# Altium footprint library texas.PCBLIB: 124 footprints (part 3 of 12)
Each footprint in its own frame and in the unit in brackets; x right, y up, seen from the top. Pads: shape width x height; smd on the part's side, far side on the other; paste and mask are expansions set on the pad; w line width, h text height; cw(c..) or ccw(c..) is an arc to the next point about the centre after c.
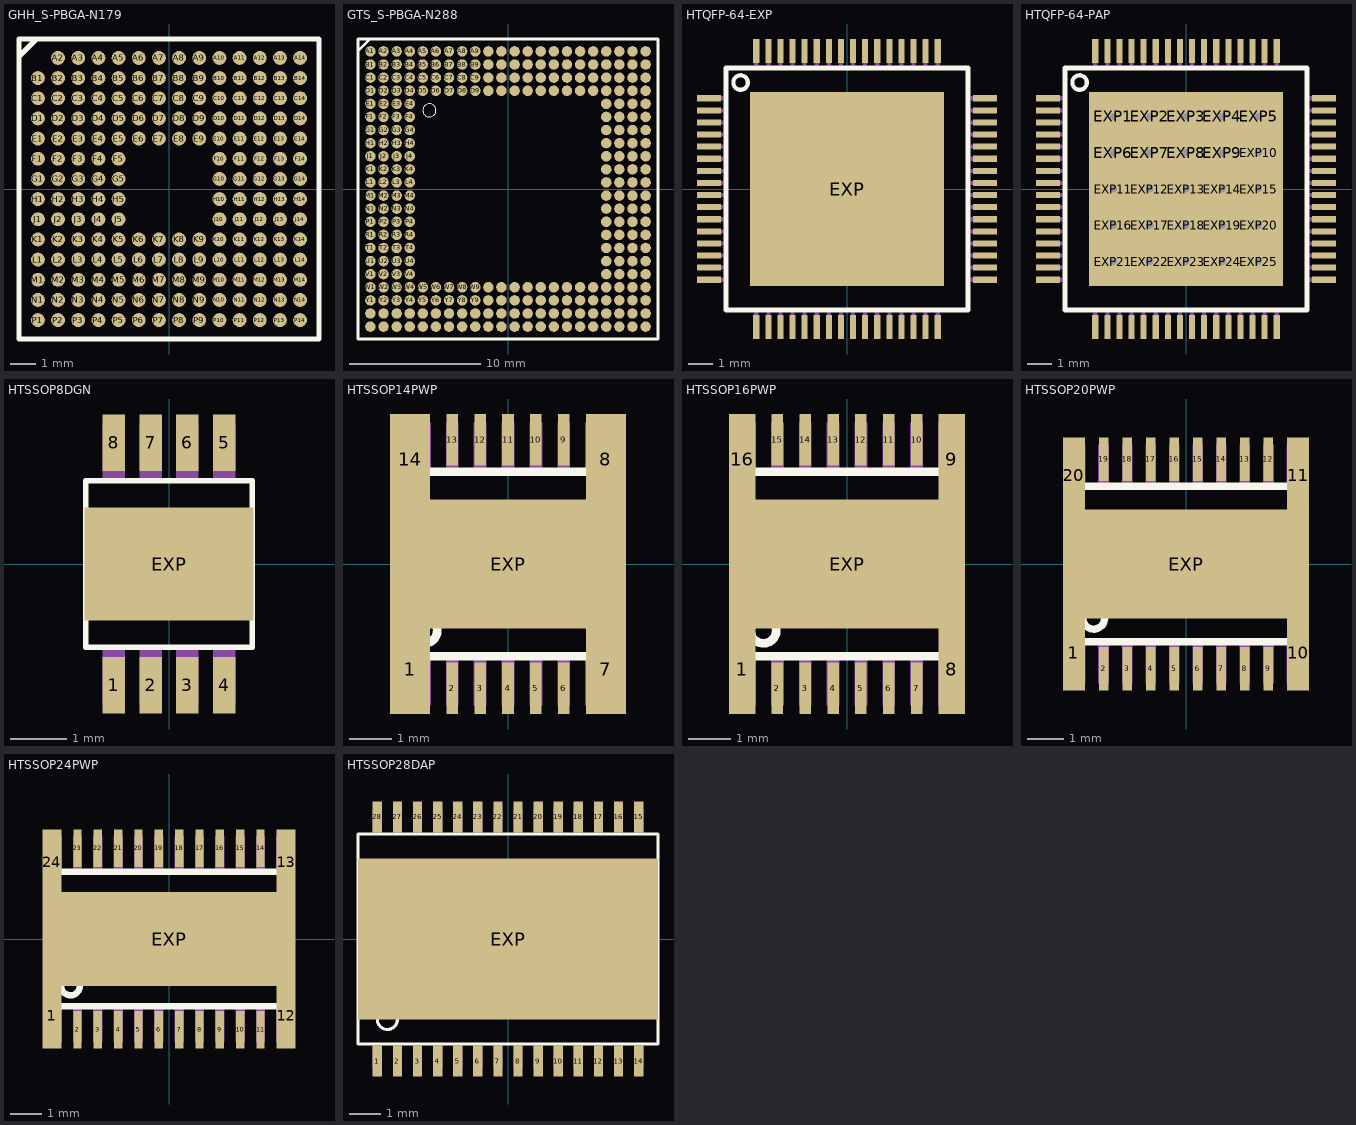
[diagram p2: the footprints below, top view; thin cyan lines are the x and y axes]

## GHH_S-PBGA-N179 [mm]
pads (179):
  rrect100% 0.55x0.55 smd: A2(-4.4,5.2) A3(-3.6,5.2) A4(-2.8,5.2) A5(-2,5.2) A6(-1.2,5.2) A7(-0.4,5.2) A8(0.4,5.2) A9(1.2,5.2) A10(2,5.2) A11(2.8,5.2) A12(3.6,5.2) A13(4.4,5.2) A14(5.2,5.2) B1(-5.2,4.4) B2(-4.4,4.4) B3(-3.6,4.4) B4(-2.8,4.4) B5(-2,4.4) B6(-1.2,4.4) B7(-0.4,4.4) B8(0.4,4.4) B9(1.2,4.4) B10(2,4.4) B11(2.8,4.4) B12(3.6,4.4) B13(4.4,4.4) B14(5.2,4.4) C1(-5.2,3.6) C2(-4.4,3.6) C3(-3.6,3.6) C4(-2.8,3.6) C5(-2,3.6) C6(-1.2,3.6) C7(-0.4,3.6) C8(0.4,3.6) C9(1.2,3.6) C10(2,3.6) C11(2.8,3.6) C12(3.6,3.6) C13(4.4,3.6) C14(5.2,3.6) D1(-5.2,2.8) D2(-4.4,2.8) D3(-3.6,2.8) D4(-2.8,2.8) D5(-2,2.8) D6(-1.2,2.8) D7(-0.4,2.8) D8(0.4,2.8) D9(1.2,2.8) D10(2,2.8) D11(2.8,2.8) D12(3.6,2.8) D13(4.4,2.8) D14(5.2,2.8) E1(-5.2,2) E2(-4.4,2) E3(-3.6,2) E4(-2.8,2) E5(-2,2) E6(-1.2,2) E7(-0.4,2) E8(0.4,2) E9(1.2,2) E10(2,2) E11(2.8,2) E12(3.6,2) E13(4.4,2) E14(5.2,2) F1(-5.2,1.2) F2(-4.4,1.2) F3(-3.6,1.2) F4(-2.8,1.2) F5(-2,1.2) F10(2,1.2) F11(2.8,1.2) F12(3.6,1.2) F13(4.4,1.2) F14(5.2,1.2) G1(-5.2,0.4) G2(-4.4,0.4) G3(-3.6,0.4) G4(-2.8,0.4) G5(-2,0.4) G10(2,0.4) G11(2.8,0.4) G12(3.6,0.4) G13(4.4,0.4) G14(5.2,0.4) H1(-5.2,-0.4) H2(-4.4,-0.4) H3(-3.6,-0.4) H4(-2.8,-0.4) H5(-2,-0.4) H10(2,-0.4) H11(2.8,-0.4) H12(3.6,-0.4) H13(4.4,-0.4) H14(5.2,-0.4) J1(-5.2,-1.2) J2(-4.4,-1.2) J3(-3.6,-1.2) J4(-2.8,-1.2) J5(-2,-1.2) J10(2,-1.2) J11(2.8,-1.2) J12(3.6,-1.2) J13(4.4,-1.2) J14(5.2,-1.2) K1(-5.2,-2) K2(-4.4,-2) K3(-3.6,-2) K4(-2.8,-2) K5(-2,-2) K6(-1.2,-2) K7(-0.4,-2) K8(0.4,-2) K9(1.2,-2) K10(2,-2) K11(2.8,-2) K12(3.6,-2) K13(4.4,-2) K14(5.2,-2) L1(-5.2,-2.8) L2(-4.4,-2.8) L3(-3.6,-2.8) L4(-2.8,-2.8) L5(-2,-2.8) L6(-1.2,-2.8) L7(-0.4,-2.8) L8(0.4,-2.8) L9(1.2,-2.8) L10(2,-2.8) L11(2.8,-2.8) L12(3.6,-2.8) L13(4.4,-2.8) L14(5.2,-2.8) M1(-5.2,-3.6) M2(-4.4,-3.6) M3(-3.6,-3.6) M4(-2.8,-3.6) M5(-2,-3.6) M6(-1.2,-3.6) M7(-0.4,-3.6) M8(0.4,-3.6) M9(1.2,-3.6) M10(2,-3.6) M11(2.8,-3.6) M12(3.6,-3.6) M13(4.4,-3.6) M14(5.2,-3.6) N1(-5.2,-4.4) N2(-4.4,-4.4) N3(-3.6,-4.4) N4(-2.8,-4.4) N5(-2,-4.4) N6(-1.2,-4.4) N7(-0.4,-4.4) N8(0.4,-4.4) N9(1.2,-4.4) N10(2,-4.4) N11(2.8,-4.4) N12(3.6,-4.4) N13(4.4,-4.4) N14(5.2,-4.4) P1(-5.2,-5.2) P2(-4.4,-5.2) P3(-3.6,-5.2) P4(-2.8,-5.2) P5(-2,-5.2) P6(-1.2,-5.2) P7(-0.4,-5.2) P8(0.4,-5.2) P9(1.2,-5.2) P10(2,-5.2) P11(2.8,-5.2) P12(3.6,-5.2) P13(4.4,-5.2) P14(5.2,-5.2)
Top Overlay:
  lines w0.203: -5.948,5.25 -5.948,5.948 -5.25,5.948 ; -5.948,5.25 -5.948,-5.948 5.948,-5.948 5.948,5.948 -5.25,5.948 ; -5.948,5.25 -5.25,5.948
Top Solder:
  drawing of 179 lines, arcs and shapes, not listed

## GTS_S-PBGA-N288 [mil]
pads (288):
  rrect100% 31.5x31.5 smd: A1(-413.39,413.39) A2(-374.02,413.39) A3(-334.65,413.39) A4(-295.28,413.39) A5(-255.91,413.39) A6(-216.54,413.39) A7(-177.17,413.39) A8(-137.8,413.39) A9(-98.43,413.39) A10(-59.06,413.39) A11(-19.69,413.39) A12(19.69,413.39) A13(59.06,413.39) A14(98.43,413.39) A15(137.8,413.39) A16(177.17,413.39) A17(216.54,413.39) A18(255.91,413.39) A19(295.28,413.39) A20(334.65,413.39) A21(374.02,413.39) A22(413.39,413.39) AA1(-413.39,-374.02) AA2(-374.02,-374.02) AA3(-334.65,-374.02) AA4(-295.28,-374.02) AA5(-255.91,-374.02) AA6(-216.54,-374.02) AA7(-177.17,-374.02) AA8(-137.8,-374.02) AA9(-98.43,-374.02) AA10(-59.06,-374.02) AA11(-19.69,-374.02) AA12(19.69,-374.02) AA13(59.06,-374.02) AA14(98.43,-374.02) AA15(137.8,-374.02) AA16(177.17,-374.02) AA17(216.54,-374.02) AA18(255.91,-374.02) AA19(295.28,-374.02) AA20(334.65,-374.02) AA21(374.02,-374.02) AA22(413.39,-374.02) AB1(-413.39,-413.39) AB2(-374.02,-413.39) AB3(-334.65,-413.39) AB4(-295.28,-413.39) AB5(-255.91,-413.39) AB6(-216.54,-413.39) AB7(-177.17,-413.39) AB8(-137.8,-413.39) AB9(-98.43,-413.39) AB10(-59.06,-413.39) AB11(-19.69,-413.39) AB12(19.69,-413.39) AB13(59.06,-413.39) AB14(98.43,-413.39) AB15(137.8,-413.39) AB16(177.17,-413.39) AB17(216.54,-413.39) AB18(255.91,-413.39) AB19(295.28,-413.39) AB20(334.65,-413.39) AB21(374.02,-413.39) AB22(413.39,-413.39) B1(-413.39,374.02) B2(-374.02,374.02) B3(-334.65,374.02) B4(-295.28,374.02) B5(-255.91,374.02) B6(-216.54,374.02) B7(-177.17,374.02) B8(-137.8,374.02) B9(-98.43,374.02) B10(-59.06,374.02) B11(-19.69,374.02) B12(19.69,374.02) B13(59.06,374.02) B14(98.43,374.02) B15(137.8,374.02) B16(177.17,374.02) B17(216.54,374.02) B18(255.91,374.02) B19(295.28,374.02) B20(334.65,374.02) B21(374.02,374.02) B22(413.39,374.02) C1(-413.39,334.65) C2(-374.02,334.65) C3(-334.65,334.65) C4(-295.28,334.65) C5(-255.91,334.65) C6(-216.54,334.65) C7(-177.17,334.65) C8(-137.8,334.65) C9(-98.43,334.65) C10(-59.06,334.65) C11(-19.69,334.65) C12(19.69,334.65) C13(59.06,334.65) C14(98.43,334.65) C15(137.8,334.65) C16(177.17,334.65) C17(216.54,334.65) C18(255.91,334.65) C19(295.28,334.65) C20(334.65,334.65) C21(374.02,334.65) C22(413.39,334.65) D1(-413.39,295.28) D2(-374.02,295.28) D3(-334.65,295.28) D4(-295.28,295.28) D5(-255.91,295.28) D6(-216.54,295.28) D7(-177.17,295.28) D8(-137.8,295.28) D9(-98.43,295.28) D10(-59.06,295.28) D11(-19.69,295.28) D12(19.69,295.28) D13(59.06,295.28) D14(98.43,295.28) D15(137.8,295.28) D16(177.17,295.28) D17(216.54,295.28) D18(255.91,295.28) D19(295.28,295.28) D20(334.65,295.28) D21(374.02,295.28) D22(413.39,295.28) E1(-413.39,255.91) E2(-374.02,255.91) E3(-334.65,255.91) E4(-295.28,255.91) E19(295.28,255.91) E20(334.65,255.91) E21(374.02,255.91) E22(413.39,255.91) F1(-413.39,216.54) F2(-374.02,216.54) F3(-334.65,216.54) F4(-295.28,216.54) F19(295.28,216.54) F20(334.65,216.54) F21(374.02,216.54) F22(413.39,216.54) G1(-413.39,177.17) G2(-374.02,177.17) G3(-334.65,177.17) G4(-295.28,177.17) G19(295.28,177.17) G20(334.65,177.17) G21(374.02,177.17) G22(413.39,177.17) H1(-413.39,137.8) H2(-374.02,137.8) H3(-334.65,137.8) H4(-295.28,137.8) H19(295.28,137.8) H20(334.65,137.8) H21(374.02,137.8) H22(413.39,137.8) J1(-413.39,98.43) J2(-374.02,98.43) J3(-334.65,98.43) J4(-295.28,98.43) J19(295.28,98.43) J20(334.65,98.43) J21(374.02,98.43) J22(413.39,98.43) K1(-413.39,59.06) K2(-374.02,59.06) K3(-334.65,59.06) K4(-295.28,59.06) K19(295.28,59.06) K20(334.65,59.06) K21(374.02,59.06) K22(413.39,59.06) L1(-413.39,19.69) L2(-374.02,19.69) L3(-334.65,19.69) L4(-295.28,19.69) L19(295.28,19.69) L20(334.65,19.69) L21(374.02,19.69) L22(413.39,19.69) M1(-413.39,-19.69) M2(-374.02,-19.69) M3(-334.65,-19.69) M4(-295.28,-19.69) M19(295.28,-19.69) M20(334.65,-19.69) M21(374.02,-19.69) M22(413.39,-19.69) N1(-413.39,-59.06) N2(-374.02,-59.06) N3(-334.65,-59.06) N4(-295.28,-59.06) N19(295.28,-59.06) N20(334.65,-59.06) N21(374.02,-59.06) N22(413.39,-59.06) P1(-413.39,-98.43) P2(-374.02,-98.43) P3(-334.65,-98.43) P4(-295.28,-98.43) P19(295.28,-98.43) P20(334.65,-98.43) P21(374.02,-98.43) P22(413.39,-98.43) R1(-413.39,-137.8) R2(-374.02,-137.8) R3(-334.65,-137.8) R4(-295.28,-137.8) R19(295.28,-137.8) R20(334.65,-137.8) R21(374.02,-137.8) R22(413.39,-137.8) T1(-413.39,-177.17) T2(-374.02,-177.17) T3(-334.65,-177.17) T4(-295.28,-177.17) T19(295.28,-177.17) T20(334.65,-177.17) T21(374.02,-177.17) T22(413.39,-177.17) U1(-413.39,-216.54) U2(-374.02,-216.54) U3(-334.65,-216.54) U4(-295.28,-216.54) U19(295.28,-216.54) U20(334.65,-216.54) U21(374.02,-216.54) U22(413.39,-216.54) V1(-413.39,-255.91) V2(-374.02,-255.91) V3(-334.65,-255.91) V4(-295.28,-255.91) V19(295.28,-255.91) V20(334.65,-255.91) V21(374.02,-255.91) V22(413.39,-255.91) W1(-413.39,-295.28) W2(-374.02,-295.28) W3(-334.65,-295.28) W4(-295.28,-295.28) W5(-255.91,-295.28) W6(-216.54,-295.28) W7(-177.17,-295.28) W8(-137.8,-295.28) W9(-98.43,-295.28) W10(-59.06,-295.28) W11(-19.69,-295.28) W12(19.69,-295.28) W13(59.06,-295.28) W14(98.43,-295.28) W15(137.8,-295.28) W16(177.17,-295.28) W17(216.54,-295.28) W18(255.91,-295.28) W19(295.28,-295.28) W20(334.65,-295.28) W21(374.02,-295.28) W22(413.39,-295.28) Y1(-413.39,-334.65) Y2(-374.02,-334.65) Y3(-334.65,-334.65) Y4(-295.28,-334.65) Y5(-255.91,-334.65) Y6(-216.54,-334.65) Y7(-177.17,-334.65) Y8(-137.8,-334.65) Y9(-98.43,-334.65) Y10(-59.06,-334.65) Y11(-19.69,-334.65) Y12(19.69,-334.65) Y13(59.06,-334.65) Y14(98.43,-334.65) Y15(137.8,-334.65) Y16(177.17,-334.65) Y17(216.54,-334.65) Y18(255.91,-334.65) Y19(295.28,-334.65) Y20(334.65,-334.65) Y21(374.02,-334.65) Y22(413.39,-334.65)
Top Overlay:
  circle w0: c-236.22,236.22 r19.69
  lines w8: -450.72,415.35 -450.72,450.72 -415.35,450.72 ; -450.72,415.35 -450.72,-450.72 450.72,-450.72 450.72,450.72 -415.35,450.72 ; -450.72,415.35 -415.35,450.72
Top Solder:
  drawing of 288 lines, arcs and shapes, not listed

## HTQFP-64-EXP [mm]
pads (65):
  rect 1x0.25 smd: 1(-5.7,3.75) 2(-5.7,3.25) 3(-5.7,2.75) 4(-5.7,2.25) 5(-5.7,1.75) 6(-5.7,1.25) 7(-5.7,0.75) 8(-5.7,0.25) 9(-5.7,-0.25) 10(-5.7,-0.75) 11(-5.7,-1.25) 12(-5.7,-1.75) 13(-5.7,-2.25) 14(-5.7,-2.75) 15(-5.7,-3.25) 16(-5.7,-3.75) 33(5.7,-3.75) 34(5.7,-3.25) 35(5.7,-2.75) 36(5.7,-2.25) 37(5.7,-1.75) 38(5.7,-1.25) 39(5.7,-0.75) 40(5.7,-0.25) 41(5.7,0.25) 42(5.7,0.75) 43(5.7,1.25) 44(5.7,1.75) 45(5.7,2.25) 46(5.7,2.75) 47(5.7,3.25) 48(5.7,3.75)
  rect 0.25x1 smd: 17(-3.75,-5.7) 18(-3.25,-5.7) 19(-2.75,-5.7) 20(-2.25,-5.7) 21(-1.75,-5.7) 22(-1.25,-5.7) 23(-0.75,-5.7) 24(-0.25,-5.7) 25(0.25,-5.7) 26(0.75,-5.7) 27(1.25,-5.7) 28(1.75,-5.7) 29(2.25,-5.7) 30(2.75,-5.7) 31(3.25,-5.7) 32(3.75,-5.7) 49(3.75,5.7) 50(3.25,5.7) 51(2.75,5.7) 52(2.25,5.7) 53(1.75,5.7) 54(1.25,5.7) 55(0.75,5.7) 56(0.25,5.7) 57(-0.25,5.7) 58(-0.75,5.7) 59(-1.25,5.7) 60(-1.75,5.7) 61(-2.25,5.7) 62(-2.75,5.7) 63(-3.25,5.7) 64(-3.75,5.7)
  rect 8x8 smd: EXP(0,0)
Top Overlay:
  circle w0.17: c-4.4,4.4 r0.3
  lines w0.203: -5,-5 5,-5 5,5 -5,5 -5,-5
Top Paste:
  rectangle: -6.2,3.625 -5.2,3.875
  rectangle: -6.2,3.125 -5.2,3.375
  rectangle: -6.2,2.625 -5.2,2.875
  rectangle: -6.2,2.125 -5.2,2.375
  rectangle: -6.2,1.625 -5.2,1.875
  rectangle: -6.2,1.125 -5.2,1.375
  rectangle: -6.2,0.625 -5.2,0.875
  rectangle: -6.2,0.125 -5.2,0.375
  rectangle: -6.2,-0.375 -5.2,-0.125
  rectangle: -6.2,-0.875 -5.2,-0.625
  rectangle: -6.2,-1.375 -5.2,-1.125
  rectangle: -6.2,-1.875 -5.2,-1.625
  rectangle: -6.2,-2.375 -5.2,-2.125
  rectangle: -6.2,-2.875 -5.2,-2.625
  rectangle: -6.2,-3.375 -5.2,-3.125
  rectangle: -6.2,-3.875 -5.2,-3.625
  region: -3.625,-6.2 -3.625,-5.2 -3.875,-5.2 -3.875,-6.2
  region: -3.125,-6.2 -3.125,-5.2 -3.375,-5.2 -3.375,-6.2
  region: -2.625,-6.2 -2.625,-5.2 -2.875,-5.2 -2.875,-6.2
  region: -2.125,-6.2 -2.125,-5.2 -2.375,-5.2 -2.375,-6.2
  region: -1.625,-6.2 -1.625,-5.2 -1.875,-5.2 -1.875,-6.2
  region: -1.125,-6.2 -1.125,-5.2 -1.375,-5.2 -1.375,-6.2
  region: -0.625,-6.2 -0.625,-5.2 -0.875,-5.2 -0.875,-6.2
  region: -0.125,-6.2 -0.125,-5.2 -0.375,-5.2 -0.375,-6.2
  region: 0.375,-6.2 0.375,-5.2 0.125,-5.2 0.125,-6.2
  region: 0.875,-6.2 0.875,-5.2 0.625,-5.2 0.625,-6.2
  region: 1.375,-6.2 1.375,-5.2 1.125,-5.2 1.125,-6.2
  region: 1.875,-6.2 1.875,-5.2 1.625,-5.2 1.625,-6.2
  region: 2.375,-6.2 2.375,-5.2 2.125,-5.2 2.125,-6.2
  region: 2.875,-6.2 2.875,-5.2 2.625,-5.2 2.625,-6.2
  region: 3.375,-6.2 3.375,-5.2 3.125,-5.2 3.125,-6.2
  region: 3.875,-6.2 3.875,-5.2 3.625,-5.2 3.625,-6.2
  region: 6.2,-3.625 5.2,-3.625 5.2,-3.875 6.2,-3.875
  region: 6.2,-3.125 5.2,-3.125 5.2,-3.375 6.2,-3.375
  region: 6.2,-2.625 5.2,-2.625 5.2,-2.875 6.2,-2.875
  region: 6.2,-2.125 5.2,-2.125 5.2,-2.375 6.2,-2.375
  region: 6.2,-1.625 5.2,-1.625 5.2,-1.875 6.2,-1.875
  region: 6.2,-1.125 5.2,-1.125 5.2,-1.375 6.2,-1.375
  region: 6.2,-0.625 5.2,-0.625 5.2,-0.875 6.2,-0.875
  region: 6.2,-0.125 5.2,-0.125 5.2,-0.375 6.2,-0.375
  region: 6.2,0.375 5.2,0.375 5.2,0.125 6.2,0.125
  region: 6.2,0.875 5.2,0.875 5.2,0.625 6.2,0.625
  region: 6.2,1.375 5.2,1.375 5.2,1.125 6.2,1.125
  region: 6.2,1.875 5.2,1.875 5.2,1.625 6.2,1.625
  region: 6.2,2.375 5.2,2.375 5.2,2.125 6.2,2.125
  region: 6.2,2.875 5.2,2.875 5.2,2.625 6.2,2.625
  region: 6.2,3.375 5.2,3.375 5.2,3.125 6.2,3.125
  region: 6.2,3.875 5.2,3.875 5.2,3.625 6.2,3.625
  region: 3.625,6.2 3.625,5.2 3.875,5.2 3.875,6.2
  region: 3.125,6.2 3.125,5.2 3.375,5.2 3.375,6.2
  region: 2.625,6.2 2.625,5.2 2.875,5.2 2.875,6.2
  region: 2.125,6.2 2.125,5.2 2.375,5.2 2.375,6.2
  region: 1.625,6.2 1.625,5.2 1.875,5.2 1.875,6.2
  region: 1.125,6.2 1.125,5.2 1.375,5.2 1.375,6.2
  region: 0.625,6.2 0.625,5.2 0.875,5.2 0.875,6.2
  region: 0.125,6.2 0.125,5.2 0.375,5.2 0.375,6.2
  region: -0.375,6.2 -0.375,5.2 -0.125,5.2 -0.125,6.2
  region: -0.875,6.2 -0.875,5.2 -0.625,5.2 -0.625,6.2
  region: -1.375,6.2 -1.375,5.2 -1.125,5.2 -1.125,6.2
  region: -1.875,6.2 -1.875,5.2 -1.625,5.2 -1.625,6.2
  region: -2.375,6.2 -2.375,5.2 -2.125,5.2 -2.125,6.2
  region: -2.875,6.2 -2.875,5.2 -2.625,5.2 -2.625,6.2
  region: -3.375,6.2 -3.375,5.2 -3.125,5.2 -3.125,6.2
  region: -3.875,6.2 -3.875,5.2 -3.625,5.2 -3.625,6.2
Top Solder:
  rectangle: -6.2,3.625 -5.2,3.875
  rectangle: -6.2,3.125 -5.2,3.375
  rectangle: -6.2,2.625 -5.2,2.875
  rectangle: -6.2,2.125 -5.2,2.375
  rectangle: -6.2,1.625 -5.2,1.875
  rectangle: -6.2,1.125 -5.2,1.375
  rectangle: -6.2,0.625 -5.2,0.875
  rectangle: -6.2,0.125 -5.2,0.375
  rectangle: -6.2,-0.375 -5.2,-0.125
  rectangle: -6.2,-0.875 -5.2,-0.625
  rectangle: -6.2,-1.375 -5.2,-1.125
  rectangle: -6.2,-1.875 -5.2,-1.625
  rectangle: -6.2,-2.375 -5.2,-2.125
  rectangle: -6.2,-2.875 -5.2,-2.625
  rectangle: -6.2,-3.375 -5.2,-3.125
  rectangle: -6.2,-3.875 -5.2,-3.625
  region: -3.625,-6.2 -3.625,-5.2 -3.875,-5.2 -3.875,-6.2
  region: -3.125,-6.2 -3.125,-5.2 -3.375,-5.2 -3.375,-6.2
  region: -2.625,-6.2 -2.625,-5.2 -2.875,-5.2 -2.875,-6.2
  region: -2.125,-6.2 -2.125,-5.2 -2.375,-5.2 -2.375,-6.2
  region: -1.625,-6.2 -1.625,-5.2 -1.875,-5.2 -1.875,-6.2
  region: -1.125,-6.2 -1.125,-5.2 -1.375,-5.2 -1.375,-6.2
  region: -0.625,-6.2 -0.625,-5.2 -0.875,-5.2 -0.875,-6.2
  region: -0.125,-6.2 -0.125,-5.2 -0.375,-5.2 -0.375,-6.2
  region: 0.375,-6.2 0.375,-5.2 0.125,-5.2 0.125,-6.2
  region: 0.875,-6.2 0.875,-5.2 0.625,-5.2 0.625,-6.2
  region: 1.375,-6.2 1.375,-5.2 1.125,-5.2 1.125,-6.2
  region: 1.875,-6.2 1.875,-5.2 1.625,-5.2 1.625,-6.2
  region: 2.375,-6.2 2.375,-5.2 2.125,-5.2 2.125,-6.2
  region: 2.875,-6.2 2.875,-5.2 2.625,-5.2 2.625,-6.2
  region: 3.375,-6.2 3.375,-5.2 3.125,-5.2 3.125,-6.2
  region: 3.875,-6.2 3.875,-5.2 3.625,-5.2 3.625,-6.2
  region: 6.2,-3.625 5.2,-3.625 5.2,-3.875 6.2,-3.875
  region: 6.2,-3.125 5.2,-3.125 5.2,-3.375 6.2,-3.375
  region: 6.2,-2.625 5.2,-2.625 5.2,-2.875 6.2,-2.875
  region: 6.2,-2.125 5.2,-2.125 5.2,-2.375 6.2,-2.375
  region: 6.2,-1.625 5.2,-1.625 5.2,-1.875 6.2,-1.875
  region: 6.2,-1.125 5.2,-1.125 5.2,-1.375 6.2,-1.375
  region: 6.2,-0.625 5.2,-0.625 5.2,-0.875 6.2,-0.875
  region: 6.2,-0.125 5.2,-0.125 5.2,-0.375 6.2,-0.375
  region: 6.2,0.375 5.2,0.375 5.2,0.125 6.2,0.125
  region: 6.2,0.875 5.2,0.875 5.2,0.625 6.2,0.625
  region: 6.2,1.375 5.2,1.375 5.2,1.125 6.2,1.125
  region: 6.2,1.875 5.2,1.875 5.2,1.625 6.2,1.625
  region: 6.2,2.375 5.2,2.375 5.2,2.125 6.2,2.125
  region: 6.2,2.875 5.2,2.875 5.2,2.625 6.2,2.625
  region: 6.2,3.375 5.2,3.375 5.2,3.125 6.2,3.125
  region: 6.2,3.875 5.2,3.875 5.2,3.625 6.2,3.625
  region: 3.625,6.2 3.625,5.2 3.875,5.2 3.875,6.2
  region: 3.125,6.2 3.125,5.2 3.375,5.2 3.375,6.2
  region: 2.625,6.2 2.625,5.2 2.875,5.2 2.875,6.2
  region: 2.125,6.2 2.125,5.2 2.375,5.2 2.375,6.2
  region: 1.625,6.2 1.625,5.2 1.875,5.2 1.875,6.2
  region: 1.125,6.2 1.125,5.2 1.375,5.2 1.375,6.2
  region: 0.625,6.2 0.625,5.2 0.875,5.2 0.875,6.2
  region: 0.125,6.2 0.125,5.2 0.375,5.2 0.375,6.2
  region: -0.375,6.2 -0.375,5.2 -0.125,5.2 -0.125,6.2
  region: -0.875,6.2 -0.875,5.2 -0.625,5.2 -0.625,6.2
  region: -1.375,6.2 -1.375,5.2 -1.125,5.2 -1.125,6.2
  region: -1.875,6.2 -1.875,5.2 -1.625,5.2 -1.625,6.2
  region: -2.375,6.2 -2.375,5.2 -2.125,5.2 -2.125,6.2
  region: -2.875,6.2 -2.875,5.2 -2.625,5.2 -2.625,6.2
  region: -3.375,6.2 -3.375,5.2 -3.125,5.2 -3.125,6.2
  region: -3.875,6.2 -3.875,5.2 -3.625,5.2 -3.625,6.2
  rectangle: -4,-4 4,4
Mechanical 16:
  rectangle: -6.1,3.665 -5.095,3.835
  rectangle: -6.1,3.165 -5.095,3.335
  rectangle: -6.1,2.665 -5.095,2.835
  rectangle: -6.1,2.165 -5.095,2.335
  rectangle: -6.1,1.665 -5.095,1.835
  rectangle: -6.1,1.165 -5.095,1.335
  rectangle: -6.1,0.665 -5.095,0.835
  rectangle: -6.1,0.165 -5.095,0.335
  rectangle: -6.1,-0.335 -5.095,-0.165
  rectangle: -6.1,-0.835 -5.095,-0.665
  rectangle: -6.1,-1.335 -5.095,-1.165
  rectangle: -6.1,-1.835 -5.095,-1.665
  rectangle: -6.1,-2.335 -5.095,-2.165
  rectangle: -6.1,-2.835 -5.095,-2.665
  rectangle: -6.1,-3.335 -5.095,-3.165
  rectangle: -6.1,-3.835 -5.095,-3.665
  region: -3.665,-6.1 -3.665,-5.095 -3.835,-5.095 -3.835,-6.1
  region: -3.165,-6.1 -3.165,-5.095 -3.335,-5.095 -3.335,-6.1
  region: -2.665,-6.1 -2.665,-5.095 -2.835,-5.095 -2.835,-6.1
  region: -2.165,-6.1 -2.165,-5.095 -2.335,-5.095 -2.335,-6.1
  region: -1.665,-6.1 -1.665,-5.095 -1.835,-5.095 -1.835,-6.1
  region: -1.165,-6.1 -1.165,-5.095 -1.335,-5.095 -1.335,-6.1
  region: -0.665,-6.1 -0.665,-5.095 -0.835,-5.095 -0.835,-6.1
  region: -0.165,-6.1 -0.165,-5.095 -0.335,-5.095 -0.335,-6.1
  region: 0.335,-6.1 0.335,-5.095 0.165,-5.095 0.165,-6.1
  region: 0.835,-6.1 0.835,-5.095 0.665,-5.095 0.665,-6.1
  region: 1.335,-6.1 1.335,-5.095 1.165,-5.095 1.165,-6.1
  region: 1.835,-6.1 1.835,-5.095 1.665,-5.095 1.665,-6.1
  region: 2.335,-6.1 2.335,-5.095 2.165,-5.095 2.165,-6.1
  region: 2.835,-6.1 2.835,-5.095 2.665,-5.095 2.665,-6.1
  region: 3.335,-6.1 3.335,-5.095 3.165,-5.095 3.165,-6.1
  region: 3.835,-6.1 3.835,-5.095 3.665,-5.095 3.665,-6.1
  region: 6.1,-3.665 5.095,-3.665 5.095,-3.835 6.1,-3.835
  region: 6.1,-3.165 5.095,-3.165 5.095,-3.335 6.1,-3.335
  region: 6.1,-2.665 5.095,-2.665 5.095,-2.835 6.1,-2.835
  region: 6.1,-2.165 5.095,-2.165 5.095,-2.335 6.1,-2.335
  region: 6.1,-1.665 5.095,-1.665 5.095,-1.835 6.1,-1.835
  region: 6.1,-1.165 5.095,-1.165 5.095,-1.335 6.1,-1.335
  region: 6.1,-0.665 5.095,-0.665 5.095,-0.835 6.1,-0.835
  region: 6.1,-0.165 5.095,-0.165 5.095,-0.335 6.1,-0.335
  region: 6.1,0.335 5.095,0.335 5.095,0.165 6.1,0.165
  region: 6.1,0.835 5.095,0.835 5.095,0.665 6.1,0.665
  region: 6.1,1.335 5.095,1.335 5.095,1.165 6.1,1.165
  region: 6.1,1.835 5.095,1.835 5.095,1.665 6.1,1.665
  region: 6.1,2.335 5.095,2.335 5.095,2.165 6.1,2.165
  region: 6.1,2.835 5.095,2.835 5.095,2.665 6.1,2.665
  region: 6.1,3.335 5.095,3.335 5.095,3.165 6.1,3.165
  region: 6.1,3.835 5.095,3.835 5.095,3.665 6.1,3.665
  region: 3.665,6.1 3.665,5.095 3.835,5.095 3.835,6.1
  region: 3.165,6.1 3.165,5.095 3.335,5.095 3.335,6.1
  region: 2.665,6.1 2.665,5.095 2.835,5.095 2.835,6.1
  region: 2.165,6.1 2.165,5.095 2.335,5.095 2.335,6.1
  region: 1.665,6.1 1.665,5.095 1.835,5.095 1.835,6.1
  region: 1.165,6.1 1.165,5.095 1.335,5.095 1.335,6.1
  region: 0.665,6.1 0.665,5.095 0.835,5.095 0.835,6.1
  region: 0.165,6.1 0.165,5.095 0.335,5.095 0.335,6.1
  region: -0.335,6.1 -0.335,5.095 -0.165,5.095 -0.165,6.1
  region: -0.835,6.1 -0.835,5.095 -0.665,5.095 -0.665,6.1
  region: -1.335,6.1 -1.335,5.095 -1.165,5.095 -1.165,6.1
  region: -1.835,6.1 -1.835,5.095 -1.665,5.095 -1.665,6.1
  region: -2.335,6.1 -2.335,5.095 -2.165,5.095 -2.165,6.1
  region: -2.835,6.1 -2.835,5.095 -2.665,5.095 -2.665,6.1
  region: -3.335,6.1 -3.335,5.095 -3.165,5.095 -3.165,6.1
  region: -3.835,6.1 -3.835,5.095 -3.665,5.095 -3.665,6.1

## HTQFP-64-PAP [mm]
pads (89):
  rect 1x0.25 smd: 1(-5.7,3.75) 2(-5.7,3.25) 3(-5.7,2.75) 4(-5.7,2.25) 5(-5.7,1.75) 6(-5.7,1.25) 7(-5.7,0.75) 8(-5.7,0.25) 9(-5.7,-0.25) 10(-5.7,-0.75) 11(-5.7,-1.25) 12(-5.7,-1.75) 13(-5.7,-2.25) 14(-5.7,-2.75) 15(-5.7,-3.25) 16(-5.7,-3.75) 33(5.7,-3.75) 34(5.7,-3.25) 35(5.7,-2.75) 36(5.7,-2.25) 37(5.7,-1.75) 38(5.7,-1.25) 39(5.7,-0.75) 40(5.7,-0.25) 41(5.7,0.25) 42(5.7,0.75) 43(5.7,1.25) 44(5.7,1.75) 45(5.7,2.25) 46(5.7,2.75) 47(5.7,3.25) 48(5.7,3.75)
  rect 0.25x1 smd: 17(-3.75,-5.7) 18(-3.25,-5.7) 19(-2.75,-5.7) 20(-2.25,-5.7) 21(-1.75,-5.7) 22(-1.25,-5.7) 23(-0.75,-5.7) 24(-0.25,-5.7) 25(0.25,-5.7) 26(0.75,-5.7) 27(1.25,-5.7) 28(1.75,-5.7) 29(2.25,-5.7) 30(2.75,-5.7) 31(3.25,-5.7) 32(3.75,-5.7) 49(3.75,5.7) 50(3.25,5.7) 51(2.75,5.7) 52(2.25,5.7) 53(1.75,5.7) 54(1.25,5.7) 55(0.75,5.7) 56(0.25,5.7) 57(-0.25,5.7) 58(-0.75,5.7) 59(-1.25,5.7) 60(-1.75,5.7) 61(-2.25,5.7) 62(-2.75,5.7) 63(-3.25,5.7) 64(-3.75,5.7)
  rect 2x2 hole 0.3: EXP1(-3,3) EXP2(-1.5,3) EXP3(0,3) EXP4(1.5,3) EXP5(3,3) EXP6(-3,1.5) EXP7(-1.5,1.5) EXP8(0,1.5) EXP9(1.5,1.5) EXP10(3,1.5) EXP11(-3,0) EXP12(-1.5,0) EXP13(0,0) EXP14(1.5,0) EXP15(3,0) EXP16(-3,-1.5) EXP17(-1.5,-1.5) EXP18(0,-1.5) EXP19(1.5,-1.5) EXP20(3,-1.5) EXP21(-3,-3) EXP22(-1.5,-3) EXP23(0,-3) EXP24(1.5,-3) EXP25(3,-3)
Top Overlay:
  circle w0.17: c-4.4,4.4 r0.3
  lines w0.203: -5,-5 5,-5 5,5 -5,5 -5,-5
Top Paste:
  rectangle: -6.2,3.625 -5.2,3.875
  rectangle: -6.2,3.125 -5.2,3.375
  rectangle: -6.2,2.625 -5.2,2.875
  rectangle: -6.2,2.125 -5.2,2.375
  rectangle: -6.2,1.625 -5.2,1.875
  rectangle: -6.2,1.125 -5.2,1.375
  rectangle: -6.2,0.625 -5.2,0.875
  rectangle: -6.2,0.125 -5.2,0.375
  rectangle: -6.2,-0.375 -5.2,-0.125
  rectangle: -6.2,-0.875 -5.2,-0.625
  rectangle: -6.2,-1.375 -5.2,-1.125
  rectangle: -6.2,-1.875 -5.2,-1.625
  rectangle: -6.2,-2.375 -5.2,-2.125
  rectangle: -6.2,-2.875 -5.2,-2.625
  rectangle: -6.2,-3.375 -5.2,-3.125
  rectangle: -6.2,-3.875 -5.2,-3.625
  region: -3.625,-6.2 -3.625,-5.2 -3.875,-5.2 -3.875,-6.2
  region: -3.125,-6.2 -3.125,-5.2 -3.375,-5.2 -3.375,-6.2
  region: -2.625,-6.2 -2.625,-5.2 -2.875,-5.2 -2.875,-6.2
  region: -2.125,-6.2 -2.125,-5.2 -2.375,-5.2 -2.375,-6.2
  region: -1.625,-6.2 -1.625,-5.2 -1.875,-5.2 -1.875,-6.2
  region: -1.125,-6.2 -1.125,-5.2 -1.375,-5.2 -1.375,-6.2
  region: -0.625,-6.2 -0.625,-5.2 -0.875,-5.2 -0.875,-6.2
  region: -0.125,-6.2 -0.125,-5.2 -0.375,-5.2 -0.375,-6.2
  region: 0.375,-6.2 0.375,-5.2 0.125,-5.2 0.125,-6.2
  region: 0.875,-6.2 0.875,-5.2 0.625,-5.2 0.625,-6.2
  region: 1.375,-6.2 1.375,-5.2 1.125,-5.2 1.125,-6.2
  region: 1.875,-6.2 1.875,-5.2 1.625,-5.2 1.625,-6.2
  region: 2.375,-6.2 2.375,-5.2 2.125,-5.2 2.125,-6.2
  region: 2.875,-6.2 2.875,-5.2 2.625,-5.2 2.625,-6.2
  region: 3.375,-6.2 3.375,-5.2 3.125,-5.2 3.125,-6.2
  region: 3.875,-6.2 3.875,-5.2 3.625,-5.2 3.625,-6.2
  region: 6.2,-3.625 5.2,-3.625 5.2,-3.875 6.2,-3.875
  region: 6.2,-3.125 5.2,-3.125 5.2,-3.375 6.2,-3.375
  region: 6.2,-2.625 5.2,-2.625 5.2,-2.875 6.2,-2.875
  region: 6.2,-2.125 5.2,-2.125 5.2,-2.375 6.2,-2.375
  region: 6.2,-1.625 5.2,-1.625 5.2,-1.875 6.2,-1.875
  region: 6.2,-1.125 5.2,-1.125 5.2,-1.375 6.2,-1.375
  region: 6.2,-0.625 5.2,-0.625 5.2,-0.875 6.2,-0.875